# Altium footprint library 电容封装库.PcbLib: 100 footprints (part 3 of 7)
Each footprint in its own frame and in the unit in brackets; x right, y up, seen from the top. Pads: shape width x height; smd on the part's side, far side on the other; paste and mask are expansions set on the pad; w line width, h text height; cw(c..) or ccw(c..) is an arc to the next point about the centre after c.
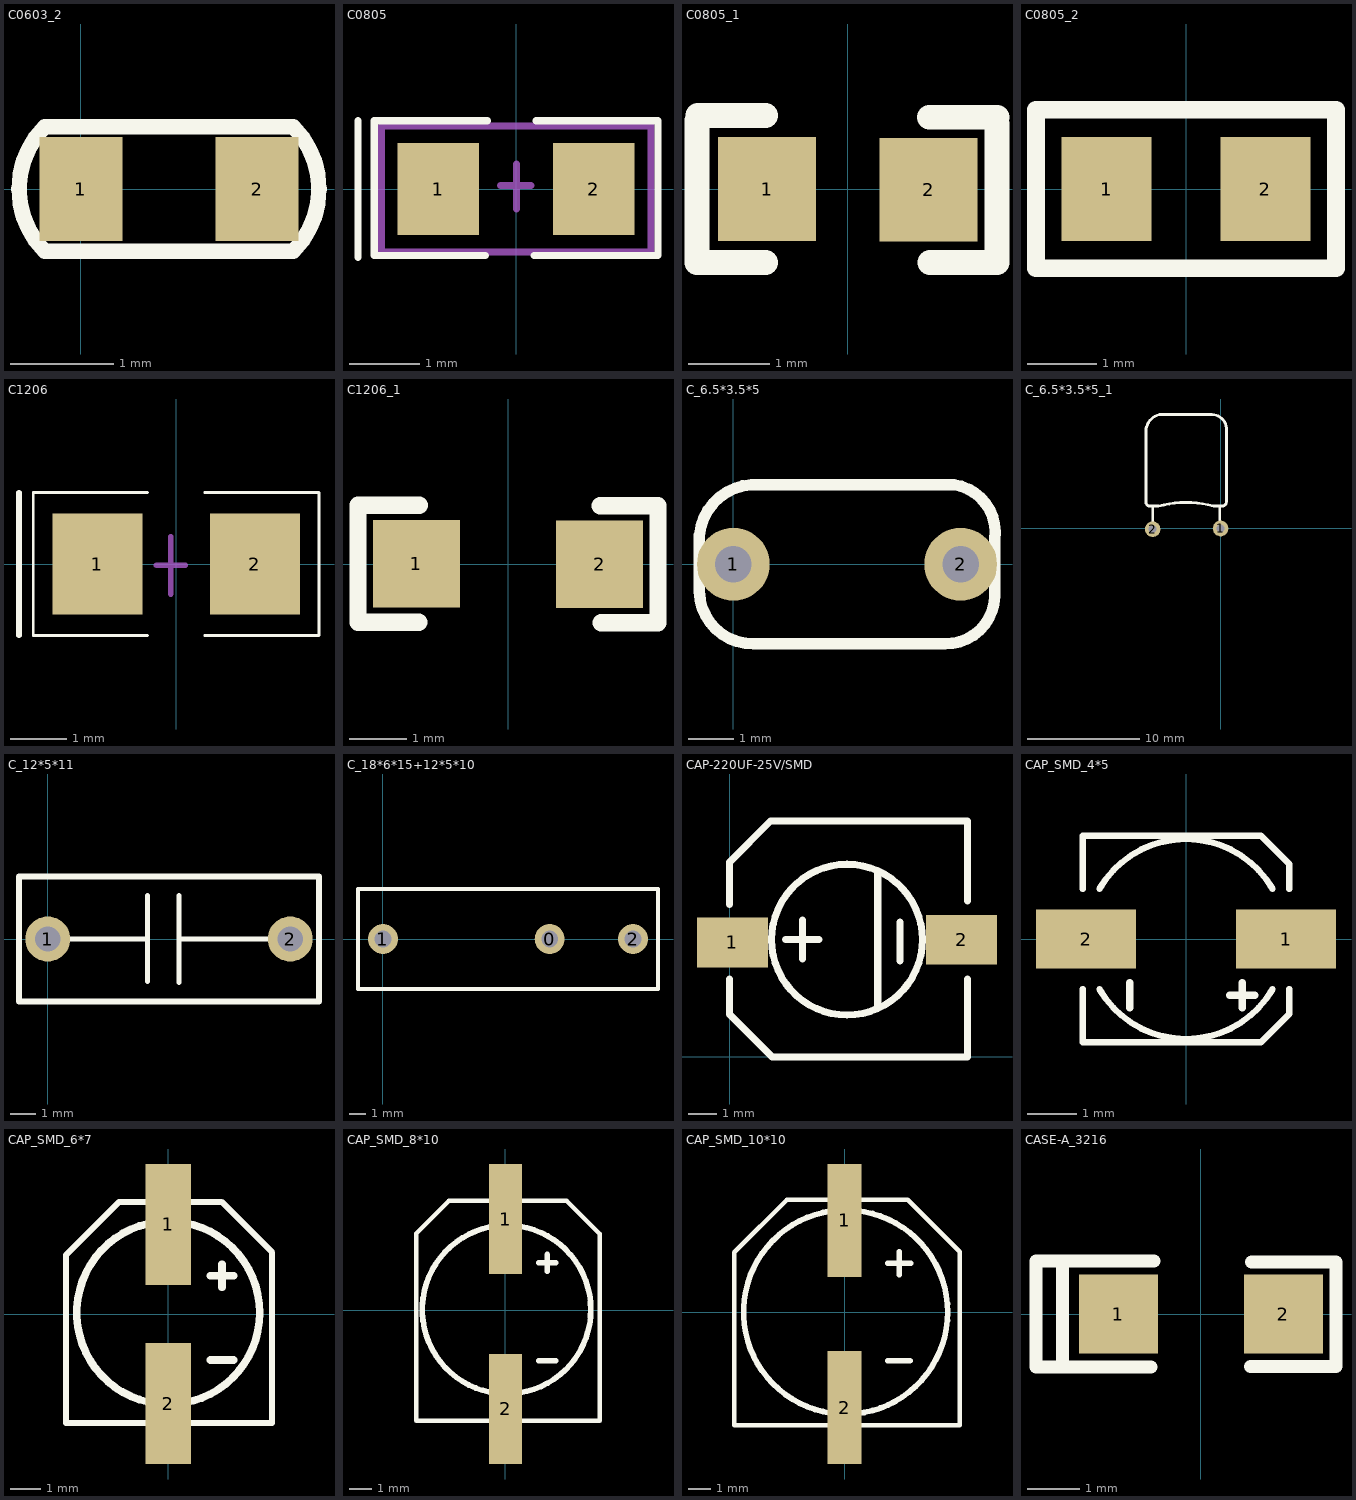
[diagram p2: the footprints below, top view; thin cyan lines are the x and y axes]

## C0603_2 [mm]
pads (2):
  rect 0.8x1 smd: 1(0,0) 2(1.7,0)
Top Overlay:
  lines w0.15: -0.35,-0.6 cw(c0.25,0) -0.35,0.6 2.05,0.6 cw(c1.45,0) 2.05,-0.6 -0.35,-0.6

## C0805 [mm]
height 0.5
pads (2):
  rect 1.15x1.3 smd: 1(-1.1,0) 2(1.1,0)
Top Overlay:
  lines w0.1: -2.235,-0.965 -2.235,0.965
  lines w0.102: -0.432,-0.94 -2.007,-0.94 -2.007,0.965 -0.406,0.965 ; 0.254,-0.94 2.007,-0.94 2.007,0.965 0.279,0.965
Mechanical 15:
  lines w0.1: -0.222,0.051 0.006,0.051 ; 0.006,-0.279 0.006,0.356 ; 0.006,0.025 0.006,0.051 ; 0.21,0.051 0.006,0.051 ; -1.905,-0.889 1.905,-0.889 1.905,0.889 -1.905,0.889 -1.905,-0.889
3D body: height 0.5, standoff -0.01, extent -0.975,-0.61 1.025,0.6

## C0805_1 [mm]
pads (2):
  rect 1.2x1.27 smd: 1(-0.99,0.005) 2(0.99,-0.005)
Top Overlay:
  lines w0.305: -1.85,-0.895 -1.85,0.845 ; -1.84,0.905 -1.01,0.905 ; -1.82,-0.895 -1.01,-0.895 ; 1,0.885 1.83,0.885 ; 1.01,-0.895 1.83,-0.895 1.83,0.805
3D body: height 0.78, standoff 0, extent -1.01,-0.61 0.99,0.64

## C0805_2 [mm]
height 0.5
pads (2):
  rect 1.3x1.5 smd: 1(-1.143,0) 2(1.143,0)
Top Overlay:
  lines w0.254: -2.159,-1.143 2.159,-1.143 2.159,0.508 2.159,1.143 -2.159,1.143 -2.159,0.635 -2.159,-1.143
3D body: height 0.6, standoff 0, extent -1,-0.625 1,0.625

## C1206 [mm]
height 1
pads (2):
  rect 1.6x1.8 smd: 1(-1.4,0) 2(1.4,0)
Top Overlay:
  lines w0.051: -0.508,-1.27 -2.54,-1.27 -2.54,1.27 -0.508,1.27 ; 0.508,-1.27 2.54,-1.27 2.54,1.27 0.508,1.27
  lines w0.1: -2.794,-1.27 -2.794,1.27
Mechanical 15:
  lines w0.1: -0.349,-0.025 0.159,-0.025 ; -0.095,-0.533 -0.095,0.483
3D body: height 1.02, standoff 0.01, extent -1.575,-0.813 1.625,0.797

## C1206_1 [mm]
height 1.99
pads (2):
  rect 1.524x1.524 smd: 1(-1.6,0.005) 2(1.6,-0.005)
Top Overlay:
  lines w0.305: -1.56,-1.015 -2.62,-1.015 -2.62,1.025 ; 1.61,1.015 2.62,1.015 2.62,-1.025 1.63,-1.025 ; -2.62,1.025 -1.55,1.025 -2.62,1.025
3D body: height 1, standoff 0, extent -1.58,-0.79 1.62,0.81

## C_6.5*3.5*5 [mm]
pads (2):
  round 1.6 hole 0.8: 1(0,0) 2(5,0)
Top Overlay:
  lines w0.25: -0.75,-0.6 ccw(c0.425,-0.575) 0.45,-1.75 4.65,-1.75 ccw(c4.675,-0.675) 5.75,-0.7 5.75,0.55 ccw(c4.7,0.7) 4.85,1.75 0.4,1.75 ccw(c0.475,0.525) -0.75,0.45 -0.75,-0.6

## C_6.5*3.5*5_1 [mm]
pads (2):
  round 1.4 hole 0.711: 1(0,0) 2(-6.07,-0.06)
Top Overlay:
  lines w0.254: -6.676,2.436 -6.676,8.69 cw(c-5.09,8.65) -5.47,10.19 -0.773,10.19 ; -6.67,2.43 ccw(c-6.3,2.37) -6.357,2 -5.55,2 ; -6.06,-0.06 -6.06,2 ; -5.569,1.994 cw(c-3.09,-7.13) -0.63,2 ; -0.77,10.193 cw(c-0.8,8.86) 0.53,8.77 ; -0.63,2 0.17,2 ccw(c0.1,2.43) 0.536,2.43 0.536,8.824 ; -0.076,0.006 -0.076,1.996

## C_12*5*11 [mm]
pads (2):
  round 1.8 hole 1: 1(0,0) 2(9.7,0)
Top Overlay:
  lines w0.2: 0,0 4,0 ; 4,-1.7 4,1.75 ; 5.25,-1.75 5.25,1.75 ; 5.25,0 9.7,0
  lines w0.254: -1.15,-2.5 10.85,-2.5 10.85,2.5 -1.15,2.5 -1.15,-2.5

## C_18*6*15+12*5*10 [mm]
pads (3):
  round 1.8 hole 1: 0(10,0) 1(0,0) 2(15,0)
Top Overlay:
  lines w0.254: -1.5,-3 16.5,-3 16.5,3 -1.5,3 -1.5,-3

## CAP-220UF-25V/SMD [mil]
pads (2):
  rect 100x70 smd: 1(3.94,161.42) 2(326.77,165.35)
Top Overlay:
  circle w10: c165.35,165.35 r106.3
  lines w10: 0,110 0,60 60,0 335,0 335,110 ; 0,215 0,275 57.5,332.5 335,332.5 335,220 ; 78.74,165.35 125.98,165.35 ; 102.36,137.8 102.36,192.91 ; 208.66,70.87 208.66,259.84 ; 240,135 240,190.11

## CAP_SMD_4*5 [mil] "贴片电解电容"
pads (2):
  rect 80x47.24 smd: 1(80,0) 2(-80,0)
Top Overlay:
  lines w5: -82.68,-40 -82.68,-82.68 60,-82.68 ; -82.68,40 -82.68,82.68 60,82.68 ; -69.28,-40 ccw(c0,0) 69.28,-40 ; -69.28,40 cw(c0,0) 69.28,40 ; 35,-82.68 60,-82.68 ; 48,82.68 60,82.68 ; 51,82.68 59,82.68 ; 82.68,-40 82.68,-60 60,-82.68 ; 82.68,40 82.68,60 60,82.68
  lines w6: -45,-55 -45,-35 ; 35,-45 55,-45 ; 45,-55 45,-35

## CAP_SMD_6*7 [mm] "贴片电解电容"
pads (2):
  rect 1.5x4 smd: 1(0,2.965) 2(0,-2.965)
Top Overlay:
  circle w0.254: c0,0.04 r3.028
  lines w0.2: -3.39,-3.608 3.44,-3.608 3.44,2.037 1.765,3.712 -1.625,3.712 -3.39,1.947 -3.39,-3.608
  lines w0.254: 1.397,-1.524 2.159,-1.524 ; 1.397,1.27 2.159,1.27 ; 1.778,0.889 1.778,1.651
3D body: height 5.4, standoff 0, extent -3.29,-3.51 3.31,3.49

## CAP_SMD_8*10 [mm] "贴片电解电容"
pads (2):
  rect 1.5x5 smd: 1(0.02,4.15) 2(0.02,-4.47)
Top Overlay:
  circle w0.254: c0.06,0.04 r3.827
  lines w0.2: -4.04,-5.005 4.29,-5.005 4.29,3.475 2.79,4.975 -2.56,4.975 -4.04,3.495 -4.04,-5.005
  lines w0.254: 1.524,-2.286 2.286,-2.286 ; 1.524,2.159 2.286,2.159 ; 1.905,1.778 1.905,2.54
3D body: height 10.3, standoff -0.2, extent -4.16,-4.86 4.34,4.84

## CAP_SMD_10*10 [mm] "贴片电解电容"
pads (2):
  rect 1.5x5 smd: 1(-0.01,4.06) 2(-0.01,-4.23)
Top Overlay:
  circle w0.254: c0.04,0 r4.522
  lines w0.2: -4.89,-5.005 -4.89,2.645 -2.56,4.975 2.79,4.975 5.09,2.675 5.09,-5.005 -4.89,-5.005
  lines w0.254: 1.905,-2.159 2.896,-2.159 ; 1.905,2.159 2.921,2.159 ; 2.413,1.651 2.413,2.667
3D body: height 10.61, standoff -0.01, extent -5.187,-5.682 5.113,5.618

## CASE-A_3216 [mil]
pads (2):
  rect 60x60 smd: 1(-62.5,0) 2(62.5,0)
Top Overlay:
  lines w9.84: -37.7,-40.16 -105,-40.16 -105,40.16 -35.73,40.16 ; 37.34,-39.76 102.3,-39.76 102.3,39.37 38.13,39.37
  lines w10: -105,-40.16 -125,-40.16 -125,40.16 -105,40.16
3D body: height 62.99, standoff 0, extent -71.95,-32.29 77.66,30.71